# Altium footprint library LukaLIBRARY.PcbLib: 784 footprints (part 7 of 49)
Each footprint in its own frame and in the unit in brackets; x right, y up, seen from the top. Pads: shape width x height; smd on the part's side, far side on the other; paste and mask are expansions set on the pad; w line width, h text height; cw(c..) or ccw(c..) is an arc to the next point about the centre after c.
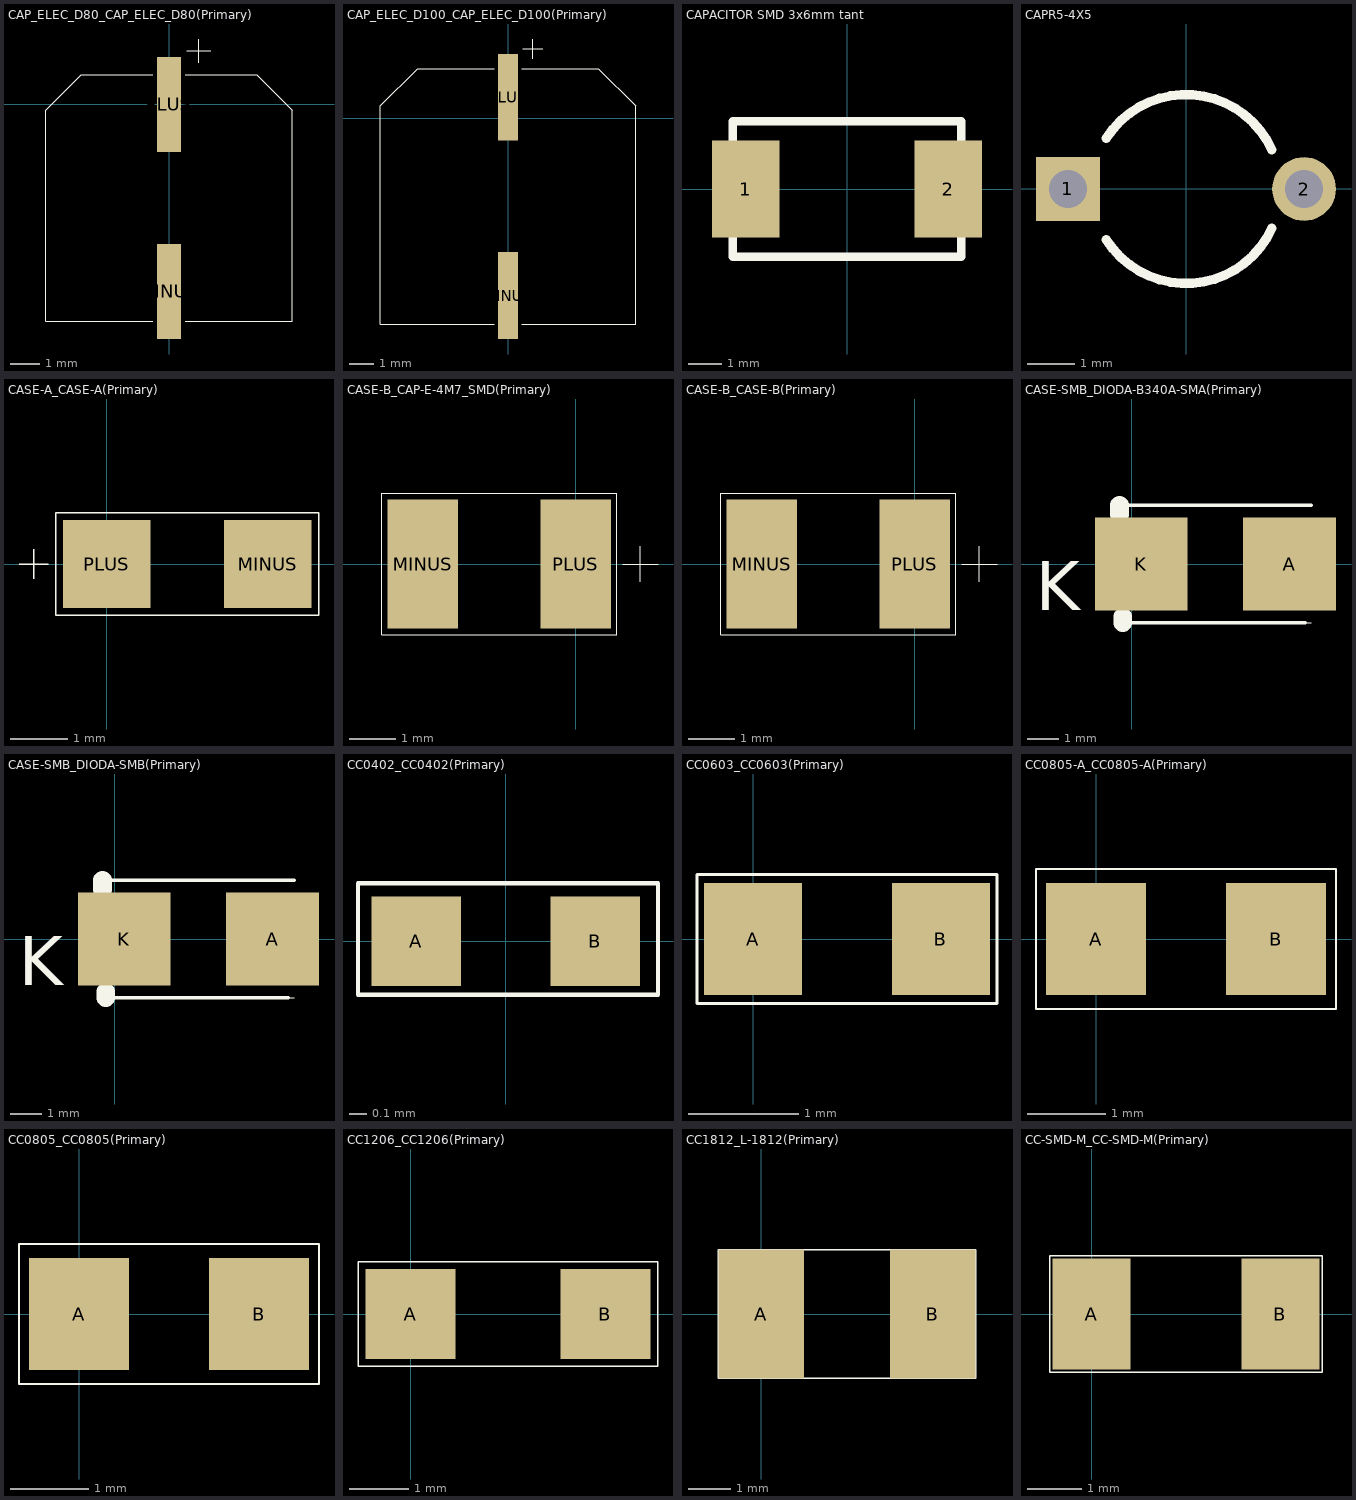
[diagram p6: the footprints below, top view; thin cyan lines are the x and y axes]

## CAP_ELEC_D80_CAP_ELEC_D80(Primary) [mm]
pads (2):
  rect 0.8x3.2 smd: MINUS(0,-6.3) PLUS(0,0)
Top Overlay:
  lines w0.025: -0.55,-7.3 -4.15,-7.3 -4.15,-0.2 -2.95,1 -0.55,1 ; 0.55,-7.3 4.15,-7.3 4.15,-0.2 2.95,1 0.55,1 ; 0.6,1.8 1.4,1.8 ; 1,1.4 1,2.2

## CAP_ELEC_D100_CAP_ELEC_D100(Primary) [mm]
pads (2):
  rect 0.8x3.5 smd: MINUS(0,-7.15) PLUS(0,0.85)
Top Overlay:
  lines w0.025: -0.55,-8.3 -5.15,-8.3 -5.15,0.5 -3.65,2 -0.55,2 ; 0.55,-8.3 5.15,-8.3 5.15,0.5 3.65,2 0.55,2 ; 0.6,2.8 1.4,2.8 ; 1,2.4 1,3.2

## CAPACITOR SMD 3x6mm tant [mil]
pads (2):
  rect 80x115 smd: 1(-120,0) 2(120,0)
Top Overlay:
  lines w10: -135,-80 -135,80 135,80 135,-80 -135,-80

## CAPR5-4X5 [mm] "Capacitor; 2 Leads"
height 12
pads (2):
  rect 1.35x1.35 hole 0.8: 1(-2.5,0)
  round 1.35 hole 0.8: 2(2.5,0)
Top Overlay:
  lines w0.2: -1.687,-1.075 ccw(c0,0) 1.819,-0.832 ; -1.687,1.075 cw(c0,0) 1.819,0.832

## CASE-A_CASE-A(Primary) [mil]
pads (2):
  rect 60x60 smd mask-1000: MINUS(110,0) PLUS(0,0)
Top Overlay:
  lines w1: -60,0 -40,0 ; -50,-10 -50,10 ; -35,-35 145,-35 145,35 -35,35 -35,-35
Top Solder:
  region: -30,-30 30,-30 30,30 -30,30
  region: 80,-30 140,-30 140,30 80,30

## CASE-B_CAP-E-4M7_SMD(Primary) [mil]
pads (2):
  rect 60x110 smd mask-1000: MINUS(-130,0) PLUS(0,0)
Top Overlay:
  lines w1: 40,0 70,0 ; 55,-15 55,15 ; -165,-60 35,-60 35,60 -165,60 -165,-60
Top Solder:
  region: 30,-55 30,55 -30,55 -30,-55
  region: -100,-55 -100,55 -160,55 -160,-55

## CASE-B_CASE-B(Primary) [mil]
pads (2):
  rect 60x110 smd mask-1000: MINUS(-130,0) PLUS(0,0)
Top Overlay:
  lines w1: 40,0 70,0 ; 55,-15 55,15 ; -165,-60 35,-60 35,60 -165,60 -165,-60
Top Solder:
  region: 30,-55 30,55 -30,55 -30,-55
  region: -100,-55 -100,55 -160,55 -160,-55

## CASE-SMB_DIODA-B340A-SMA(Primary) [mm]
pads (2):
  rect 3x3 smd mask-25.4: A(5.1,0) K(0.3,0)
Top Overlay:
  lines w0.025: -0.4,-1.9 5.8,-1.9 ; 3.683,-0.889 3.683,0.889
  lines w0.125: -0.4,1.9 5.8,1.9 ; 0,-1.9 5.6,-1.9
  lines w0.6: -0.4,1.6 -0.4,1.9 ; -0.3,-1.9 -0.3,-1.7
  text "K" at -3.1,-1.5 h1.59
Top Solder:
  region: 3.6,-1.5 6.6,-1.5 6.6,1.5 3.6,1.5
  region: -1.2,-1.5 1.8,-1.5 1.8,1.5 -1.2,1.5

## CASE-SMB_DIODA-SMB(Primary) [mm]
pads (2):
  rect 3x3 smd mask-25.4: A(5.1,0) K(0.3,0)
Top Overlay:
  lines w0.025: -0.4,-1.9 5.8,-1.9 ; 3.683,-0.889 3.683,0.889
  lines w0.125: -0.4,1.9 5.8,1.9 ; 0,-1.9 5.6,-1.9
  lines w0.6: -0.4,1.6 -0.4,1.9 ; -0.3,-1.9 -0.3,-1.7
  text "K" at -3.1,-1.5 h1.59
Top Solder:
  region: -1.2,-1.5 1.8,-1.5 1.8,1.5 -1.2,1.5
  region: 3.6,-1.5 6.6,-1.5 6.6,1.5 3.6,1.5

## CC0402_CC0402(Primary) [mil]
pads (2):
  rect 20x20 smd mask-1000: A(-20,0) B(20,0)
Top Overlay:
  lines w1: -33,-12 34,-12 34,13 -33,13 -33,-12
Top Solder:
  region: -30,-10 -10,-10 -10,10 -30,10
  region: 10,-10 30,-10 30,10 10,10

## CC0603_CC0603(Primary) [mil]
pads (2):
  rect 35x40 smd mask-1000: A(0,0) B(67,0)
Top Overlay:
  lines w1: -20,-23 -20,23 87,23 87,-23 -20,-23
Top Solder:
  region: 49.5,-20 84.5,-20 84.5,20 49.5,20
  region: -17.5,-20 17.5,-20 17.5,20 -17.5,20

## CC0805-A_CC0805-A(Primary) [mil]
pads (2):
  rect 50x56 smd mask-1000: A(0,0) B(90,0)
Top Overlay:
  lines w1: -30,-35 120,-35 120,35 -30,35 -30,-35
Top Solder:
  region: -25,-28 25,-28 25,28 -25,28
  region: 65,-28 115,-28 115,28 65,28

## CC0805_CC0805(Primary) [mil]
pads (2):
  rect 50x56 smd mask-1000: A(0,0) B(90,0)
Top Overlay:
  lines w1: -30,-35 120,-35 120,35 -30,35 -30,-35
Top Solder:
  region: -25,-28 25,-28 25,28 -25,28
  region: 65,-28 115,-28 115,28 65,28

## CC1206_CC1206(Primary) [mil]
pads (2):
  rect 60x60 smd mask-1000: A(0,0) B(130,0)
Top Overlay:
  lines w1: -35,-35 165,-35 165,35 -35,35 -35,-35
Top Solder:
  region: 100,-30 160,-30 160,30 100,30
  region: -30,-30 30,-30 30,30 -30,30

## CC1812_L-1812(Primary) [mm]
pads (2):
  rect 2x3 smd mask-25.4: A(0,0) B(4,0)
Top Overlay:
  lines w0.03: -1,-1.5 5,-1.5 5,1.5 2,1.5 -1,1.5 -1,-1.5
Top Solder:
  region: 3,-1.5 5,-1.5 5,1.5 3,1.5
  region: -1,-1.5 1,-1.5 1,1.5 -1,1.5

## CC-SMD-M_CC-SMD-M(Primary) [mil]
pads (2):
  rect 56x80 smd mask-1000: A(0,0) B(136,0)
Top Overlay:
  lines w1: -30,-42 166,-42 166,42 -30,42 -30,-42
Top Solder:
  region: -28,-40 28,-40 28,40 -28,40
  region: 108,-40 164,-40 164,40 108,40